# Altium footprint library SOP127P.PcbLib: 19 footprints (part 2 of 2)
Each footprint in its own frame and in the unit in brackets; x right, y up, seen from the top. Pads: shape width x height; smd on the part's side, far side on the other; paste and mask are expansions set on the pad; w line width, h text height; cw(c..) or ccw(c..) is an arc to the next point about the centre after c.
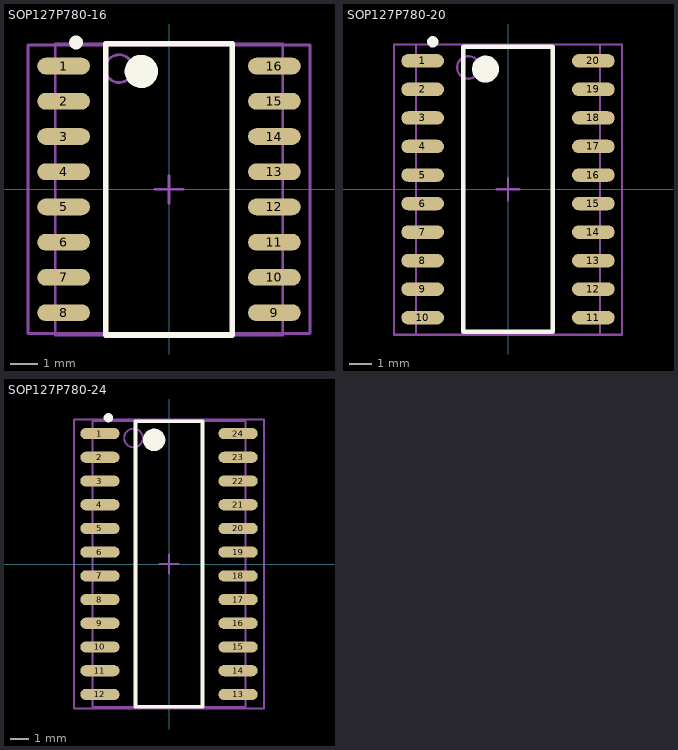
[diagram p1: the footprints below, top view; thin cyan lines are the x and y axes]

## SOP127P780-16 [mm] "SOP, 16-Leads, Body 10.1x5.3mm, Pitch 1.27mm, IPC High Density"
height 2.1
pads (16):
  oval 1.9x0.6 smd: 1(-3.8,4.445) 2(-3.8,3.175) 3(-3.8,1.905) 4(-3.8,0.635) 5(-3.8,-0.635) 6(-3.8,-1.905) 7(-3.8,-3.175) 8(-3.8,-4.445) 9(3.8,-4.445) 10(3.8,-3.175) 11(3.8,-1.905) 12(3.8,-0.635) 13(3.8,0.635) 14(3.8,1.905) 15(3.8,3.175) 16(3.8,4.445)
Top Overlay:
  circle w0.6: c-1,4.25 r0.3
  circle w0.25: c-3.35,5.295 r0.125
  lines w0.2: -2.286,-5.25 2.286,-5.25 2.286,5.25 -2.286,5.25 -2.286,-5.25
Mechanical 13:
  circle w0.1: c-1.8,4.35 r0.5
  lines w0.1: -4.1,-5.25 4.1,-5.25 4.1,5.25 -4.1,5.25 -4.1,-5.25
Mechanical 15:
  lines w0.1: -0.5,0 0.5,0 ; 0,-0.5 0,0.5 ; -5.08,-5.2 5.08,-5.2 5.08,5.2 -5.08,5.2 -5.08,-5.2
3D body "so127p780-16.stp": height 2.05, standoff 0.05, extent -4.1,-5.25 4.1,5.25

## SOP127P780-20 [mm] "SOP, 20-Leads, Body 12.6x5.3mm, Pitch 1.27mm, IPC High Density"
height 1.96
pads (20):
  oval 1.9x0.6 smd: 1(-3.8,5.715) 2(-3.8,4.445) 3(-3.8,3.175) 4(-3.8,1.905) 5(-3.8,0.635) 6(-3.8,-0.635) 7(-3.8,-1.905) 8(-3.8,-3.175) 9(-3.8,-4.445) 10(-3.8,-5.715) 11(3.8,-5.715) 12(3.8,-4.445) 13(3.8,-3.175) 14(3.8,-1.905) 15(3.8,-0.635) 16(3.8,0.635) 17(3.8,1.905) 18(3.8,3.175) 19(3.8,4.445) 20(3.8,5.715)
Top Overlay:
  circle w0.6: c-1,5.35 r0.3
  circle w0.25: c-3.35,6.565 r0.125
  lines w0.2: -2,-6.35 2,-6.35 2,6.35 -2,6.35 -2,-6.35
Mechanical 13:
  circle w0.1: c-1.765,5.425 r0.5
  lines w0.1: -4.1,-6.477 4.1,-6.477 4.1,6.45 -4.1,6.45 -4.1,-6.477
Mechanical 15:
  lines w0.1: -0.5,0 0.5,0 ; 0,-0.5 0,0.5 ; -5.08,-6.477 5.08,-6.477 5.08,6.45 -5.08,6.45 -5.08,-6.477
3D body "so127p780-20.stp": height 2.05, standoff 0.05, extent -4.1,-6.45 4.1,6.45

## SOP127P780-24 [mm] "24-Pin Small Outline Package 1.27 mm Pitch"
height 2
pads (24):
  oval 2.1x0.6 smd: 1(-3.7,6.985) 2(-3.7,5.715) 3(-3.7,4.445) 4(-3.7,3.175) 5(-3.7,1.905) 6(-3.7,0.635) 7(-3.7,-0.635) 8(-3.7,-1.905) 9(-3.7,-3.175) 10(-3.7,-4.445) 11(-3.7,-5.715) 12(-3.7,-6.985) 13(3.7,-6.985) 14(3.7,-5.715) 15(3.7,-4.445) 16(3.7,-3.175) 17(3.7,-1.905) 18(3.7,-0.635) 19(3.7,0.635) 20(3.7,1.905) 21(3.7,3.175) 22(3.7,4.445) 23(3.7,5.715) 24(3.7,6.985)
Top Overlay:
  circle w0.6: c-0.8,6.65 r0.3
  circle w0.25: c-3.25,7.835 r0.125
  lines w0.2: -1.8,-7.65 1.8,-7.65 1.8,7.65 -1.8,7.65 -1.8,-7.65
Mechanical 13:
  circle w0.1: c-1.9,6.75 r0.5
  lines w0.1: -4.1,-7.65 4.1,-7.65 4.1,7.65 -4.1,7.65 -4.1,-7.65
Mechanical 15:
  lines w0.1: -0.5,0 0.5,0 ; 0,-0.5 0,0.5 ; -5.08,-7.75 5.08,-7.75 5.08,7.75 -5.08,7.75 -5.08,-7.75
3D body "so127p780-24.stp": height 2.05, standoff 0.05, extent -4.1,-7.65 4.1,7.65